# Altium footprint library XU-GENARAL PCB .PcbLib: 1176 footprints (part 61 of 75)
Each footprint in its own frame and in the unit in brackets; x right, y up, seen from the top. Pads: shape width x height; smd on the part's side, far side on the other; paste and mask are expansions set on the pad; w line width, h text height; cw(c..) or ccw(c..) is an arc to the next point about the centre after c.
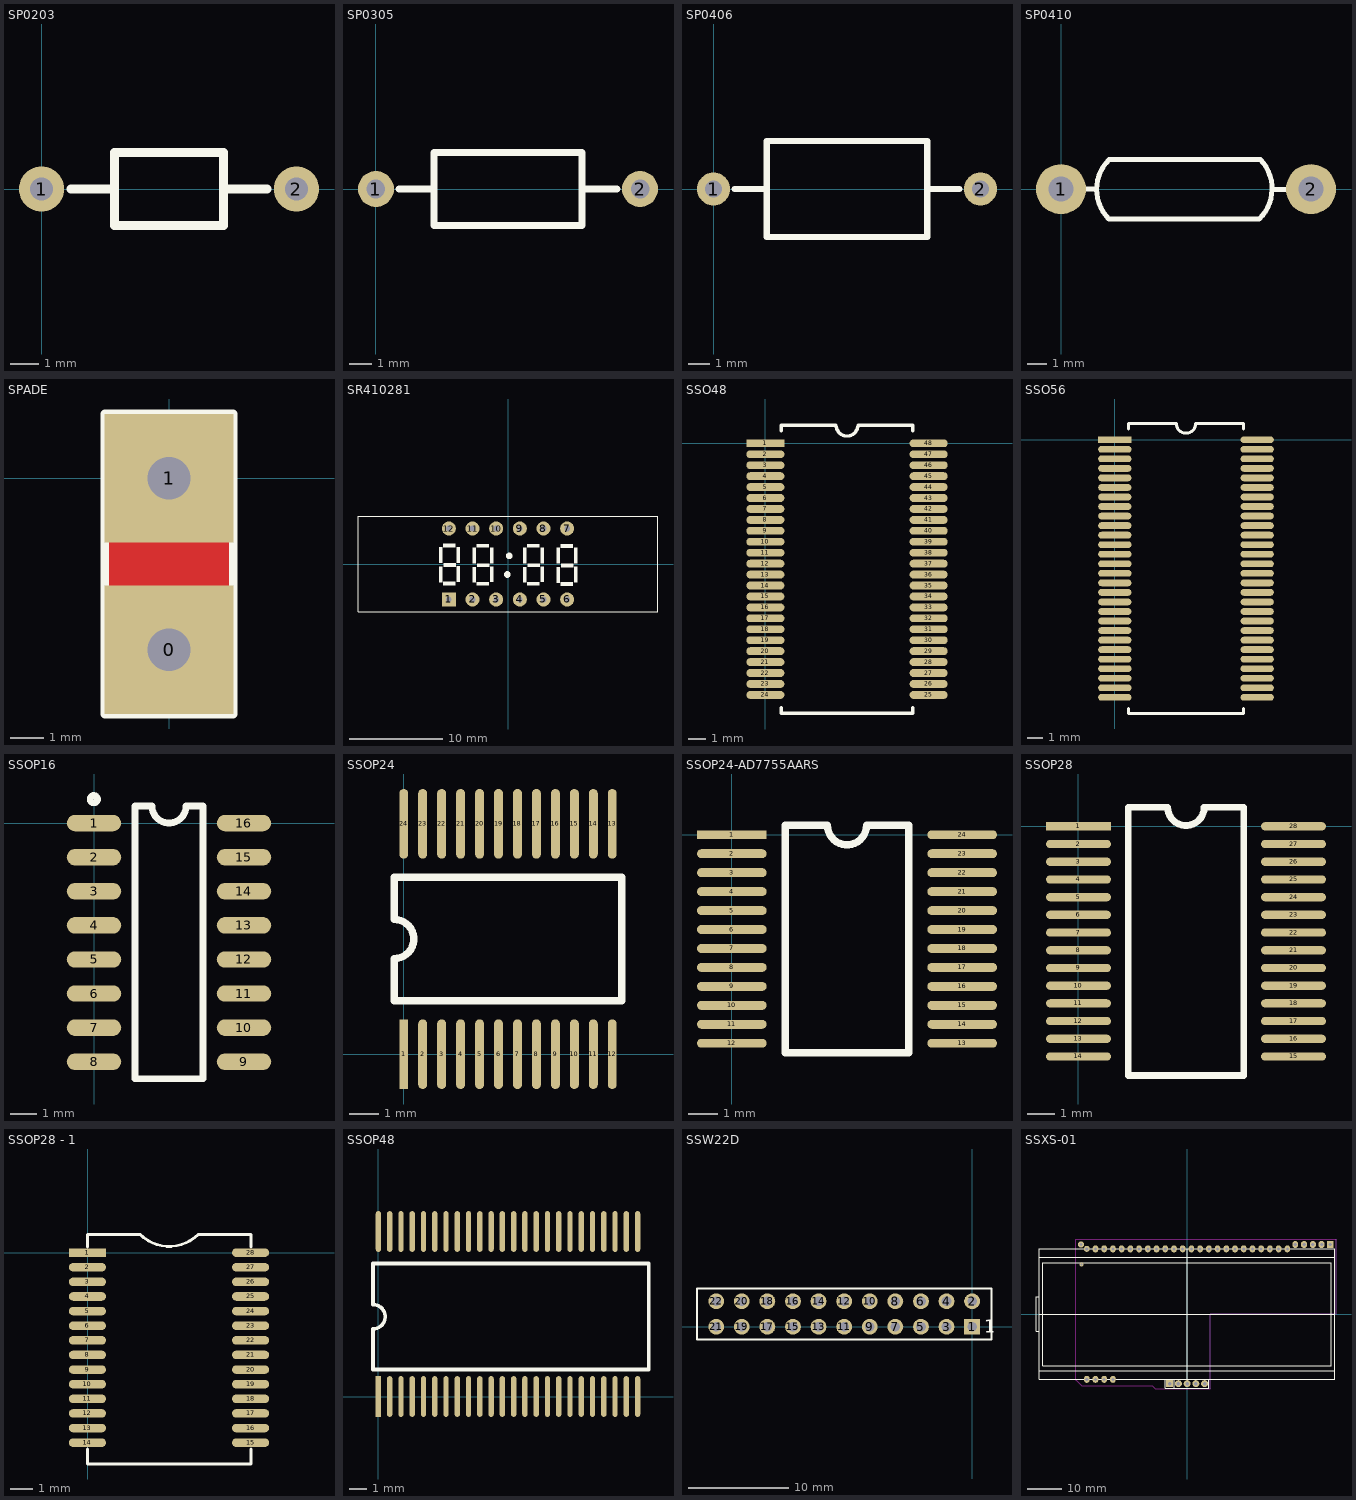
[diagram p60: the footprints below, top view; thin cyan lines are the x and y axes]

## SP0203 [mil]
pads (2):
  round 62 hole 32: 1(0,0) 2(350,0)
Top Overlay:
  lines w12: 40,0 100,0 ; 250,0 310,0 ; 100,-50 100,50 250,50 250,-50 100,-50

## SP0305 [mil]
pads (2):
  round 62 hole 32: 1(0,0) 2(456,0)
Top Overlay:
  lines w12: 40,0 100,0 ; 356,0 416,0 ; 100,-63 100,63 356,63 356,-63 100,-63

## SP0406 [mil]
pads (2):
  round 62 hole 32: 1(0,0) 2(500,0)
Top Overlay:
  lines w12: 40,0 100,0 ; 400,0 460,0 ; 100,-90 100,90 400,90 400,-90 100,-90

## SP0410 [mil]
pads (2):
  round 100 hole 50: 1(0,0) 2(500,0)
Top Overlay:
  lines w10: 28,0 70,0 ; 424,-1 468,-1 ; 96,-60 cw(c155.5,-0.5) 96,59 399,59 cw(c338,1) 396,-60 96,-60

## SPADE [mil]
pads (2):
  rect 150x150 hole 50: 0(0,-200) 1(0,0)
Top Layer:
  rectangle: -75,-150 75,-50
Bottom Layer:
  rectangle: -75,-150 75,-50
Top Overlay:
  lines w10: -75,-275 -75,75 75,75 75,-275 -75,-275

## SR410281 [mm]
pads (12):
  rect 1.5x1.5 hole 0.6: 1(-6.35,-3.81)
  round 1.5 hole 0.6: 2(-3.81,-3.81) 3(-1.27,-3.81) 4(1.27,-3.81) 5(3.81,-3.81) 6(6.35,-3.81) 7(6.35,3.81) 8(3.81,3.81) 9(1.27,3.81) 10(-1.27,3.81) 11(-3.81,3.81) 12(-6.35,3.81)
Top Overlay:
  circle w0.508: c-0.075,-1.127 r0.1
  circle w0.508: c0.125,0.873 r0.1
  rectangle: 2.057,-2.311 3.404,-1.911
  region: 3.886,-1.956 3.886,-0.254 3.486,-0.254 3.486,-1.956
  region: 2,-2.007 2,-0.305 1.6,-0.305 1.6,-2.007
  region: 3.886,0.076 3.886,1.778 3.486,1.778 3.486,0.076
  rectangle: 2.057,1.759 3.404,2.159
  region: 2,0.076 2,1.778 1.6,1.778 1.6,0.076
  rectangle: 2.083,-0.327 3.429,0.073
  rectangle: 5.639,-2.337 6.985,-1.937
  region: 7.468,-1.981 7.468,-0.279 7.068,-0.279 7.068,-1.981
  region: 5.582,-2.032 5.582,-0.33 5.182,-0.33 5.182,-2.032
  region: 7.468,0.051 7.468,1.753 7.068,1.753 7.068,0.051
  rectangle: 5.639,1.734 6.985,2.134
  region: 5.582,0.051 5.582,1.753 5.182,1.753 5.182,0.051
  rectangle: 5.664,-0.352 7.01,0.048
  rectangle: -6.96,-2.286 -5.613,-1.886
  region: -5.131,-1.93 -5.131,-0.229 -5.531,-0.229 -5.531,-1.93
  region: -7.017,-1.981 -7.017,-0.279 -7.417,-0.279 -7.417,-1.981
  region: -5.131,0.102 -5.131,1.803 -5.531,1.803 -5.531,0.102
  rectangle: -6.96,1.784 -5.613,2.184
  region: -7.017,0.102 -7.017,1.803 -7.417,1.803 -7.417,0.102
  rectangle: -6.934,-0.302 -5.588,0.098
  rectangle: -3.378,-2.311 -2.032,-1.911
  region: -1.549,-1.956 -1.549,-0.254 -1.949,-0.254 -1.949,-1.956
  region: -3.435,-2.007 -3.435,-0.305 -3.835,-0.305 -3.835,-2.007
  region: -1.549,0.076 -1.549,1.778 -1.949,1.778 -1.949,0.076
  rectangle: -3.378,1.759 -2.032,2.159
  region: -3.435,0.076 -3.435,1.778 -3.835,1.778 -3.835,0.076
  rectangle: -3.353,-0.327 -2.007,0.073
  lines w0.127: -16.1,-5.1 16.1,-5.1 16.1,5.1 -16.1,5.1 -16.1,-5.1

## SSO48 [mm]
pads (48):
  rect 2.2x0.45 smd: 1(0,0)
  oval 2.2x0.45 smd: 2(0,-0.63) 3(0,-1.26) 4(0,-1.89) 5(0,-2.52) 6(0,-3.15) 7(0,-3.78) 8(0,-4.41) 9(0,-5.04) 10(0,-5.67) 11(0,-6.3) 12(0,-6.93) 13(0,-7.56) 14(0,-8.19) 15(0,-8.82) 16(0,-9.45) 17(0,-10.08) 18(0,-10.71) 19(0,-11.34) 20(0,-11.97) 21(0,-12.6) 22(0,-13.23) 23(0,-13.86) 24(0,-14.49) 25(9.4,-14.49) 26(9.4,-13.86) 27(9.4,-13.23) 28(9.4,-12.6) 29(9.4,-11.97) 30(9.4,-11.34) 31(9.4,-10.71) 32(9.4,-10.08) 33(9.4,-9.45) 34(9.4,-8.82) 35(9.4,-8.19) 36(9.4,-7.56) 37(9.4,-6.93) 38(9.4,-6.3) 39(9.4,-5.67) 40(9.4,-5.04) 41(9.4,-4.41) 42(9.4,-3.78) 43(9.4,-3.15) 44(9.4,-2.52) 45(9.4,-1.89) 46(9.4,-1.26) 47(9.4,-0.63) 48(9.4,0)
Top Overlay:
  lines w0.2: 0.9,-15.215 0.9,-15.545 8.5,-15.545 8.5,-15.215 ; 0.9,0.725 0.9,1.055 4.065,1.055 ccw(c4.7,1.055) 5.335,1.055 8.5,1.055 8.5,0.725

## SSO56 [mm]
pads (56):
  rect 2.2x0.45 smd: 1(0,0)
  oval 2.2x0.45 smd: 2(0,-0.63) 3(0,-1.26) 4(0,-1.89) 5(0,-2.52) 6(0,-3.15) 7(0,-3.78) 8(0,-4.41) 9(0,-5.04) 10(0,-5.67) 11(0,-6.3) 12(0,-6.93) 13(0,-7.56) 14(0,-8.19) 15(0,-8.82) 16(0,-9.45) 17(0,-10.08) 18(0,-10.71) 19(0,-11.34) 20(0,-11.97) 21(0,-12.6) 22(0,-13.23) 23(0,-13.86) 24(0,-14.49) 25(0,-15.12) 26(0,-15.75) 27(0,-16.38) 28(0,-17.01) 29(9.4,-17.01) 30(9.4,-16.38) 31(9.4,-15.75) 32(9.4,-15.12) 33(9.4,-14.49) 34(9.4,-13.86) 35(9.4,-13.23) 36(9.4,-12.6) 37(9.4,-11.97) 38(9.4,-11.34) 39(9.4,-10.71) 40(9.4,-10.08) 41(9.4,-9.45) 42(9.4,-8.82) 43(9.4,-8.19) 44(9.4,-7.56) 45(9.4,-6.93) 46(9.4,-6.3) 47(9.4,-5.67) 48(9.4,-5.04) 49(9.4,-4.41) 50(9.4,-3.78) 51(9.4,-3.15) 52(9.4,-2.52) 53(9.4,-1.89) 54(9.4,-1.26) 55(9.4,-0.63) 56(9.4,0)
Top Overlay:
  lines w0.2: 0.9,-17.735 0.9,-18.075 8.5,-18.075 8.5,-17.735 ; 0.9,0.725 0.9,1.065 4.065,1.065 ccw(c4.7,1.065) 5.335,1.065 8.5,1.065 8.5,0.725

## SSOP16 [mil]
height 43.31
pads (16):
  oval 80x24 smd: 1(0,0) 2(0,-50) 3(0,-100) 4(0,-150) 5(0,-200) 6(0,-250) 7(0,-300) 8(0,-350) 9(220,-350) 10(220,-300) 11(220,-250) 12(220,-200) 13(220,-150) 14(220,-100) 15(220,-50) 16(220,0)
Top Overlay:
  circle w10: c-0.3,35 r5.3
  lines w10: 60,-375 60,25 85,25 ccw(c110,25) 135,25 160,25 160,-375 60,-375

## SSOP24 [mil]
pads (24):
  rect 12x94 smd: 1(0,0)
  oval 12x94 smd: 2(25.6,0) 3(51.2,0) 4(76.8,0) 5(102.4,0) 6(128,0) 7(153.6,0) 8(179.2,0) 9(204.8,0) 10(230.4,0) 11(256,0) 12(281.6,0) 13(281.6,311) 14(256,311) 15(230.4,311) 16(204.8,311) 17(179.2,311) 18(153.6,311) 19(128,311) 20(102.4,311) 21(76.8,311) 22(51.2,311) 23(25.6,311) 24(0,311)
Top Overlay:
  lines w10: -12.8,72 -12.8,129.1 ccw(c-12.8,155.5) -12.8,181.9 -12.8,239 294.4,239 294.4,72 -12.8,72

## SSOP24-AD7755AARS [mil]
pads (24):
  rect 94x12 smd: 1(0,0)
  oval 94x12 smd: 2(0,-25.6) 3(0,-51.2) 4(0,-76.8) 5(0,-102.4) 6(0,-128) 7(0,-153.6) 8(0,-179.2) 9(0,-204.8) 10(0,-230.4) 11(0,-256) 12(0,-281.6) 13(311,-281.6) 14(311,-256) 15(311,-230.4) 16(311,-204.8) 17(311,-179.2) 18(311,-153.6) 19(311,-128) 20(311,-102.4) 21(311,-76.8) 22(311,-51.2) 23(311,-25.6) 24(311,0)
Top Overlay:
  lines w10: 72,-294.4 72,12.8 129.1,12.8 ccw(c155.5,12.8) 181.9,12.8 239,12.8 239,-294.4 72,-294.4

## SSOP28 [mil]
pads (28):
  rect 94x12 smd: 1(0,0)
  oval 94x12 smd: 2(0,-25.6) 3(0,-51.2) 4(0,-76.8) 5(0,-102.4) 6(0,-128) 7(0,-153.6) 8(0,-179.2) 9(0,-204.8) 10(0,-230.4) 11(0,-256) 12(0,-281.6) 13(0,-307.2) 14(0,-332.8) 15(311,-332.8) 16(311,-307.2) 17(311,-281.6) 18(311,-256) 19(311,-230.4) 20(311,-204.8) 21(311,-179.2) 22(311,-153.6) 23(311,-128) 24(311,-102.4) 25(311,-76.8) 26(311,-51.2) 27(311,-25.6) 28(311,0)
Top Overlay:
  lines w10: 181.8,27.6 cw(c155.4,27.6) 129,27.6 72,27.6 72,-360.4 239,-360.4 239,27.6 182,27.6

## SSOP28 - 1 [mil]
pads (28):
  rect 65x15 smd: 1(-0.17,-0.03)
  oval 65x15 smd: 2(-0.17,-25.62) 3(-0.17,-51.21) 4(-0.17,-76.8) 5(-0.17,-102.39) 6(-0.17,-127.98) 7(-0.17,-153.57) 8(-0.17,-179.17) 9(-0.17,-204.76) 10(-0.17,-230.35) 11(-0.17,-255.94) 12(-0.17,-281.53) 13(-0.17,-307.12) 14(-0.17,-332.71) 15(285.27,-332.71) 16(285.27,-307.12) 17(285.27,-281.53) 18(285.27,-255.94) 19(285.27,-230.35) 20(285.27,-204.76) 21(285.27,-179.17) 22(285.27,-153.57) 23(285.27,-127.98) 24(285.27,-102.39) 25(285.27,-76.8) 26(285.27,-51.21) 27(285.27,-25.62) 28(285.27,-0.03)
Top Overlay:
  lines w5: -0.17,-344.03 -0.17,-370.06 285.83,-370.06 285.83,-344.03 ; -0.17,9.97 -0.17,31.97 91.83,31.97 ccw(c142.83,82.97) 193.83,31.97 285.83,31.97 285.83,9.97

## SSOP48 [mm]
pads (48):
  rect 0.3x2.3 smd: 1(0,0)
  oval 0.3x2.3 smd: 2(0.635,0) 3(1.27,0) 4(1.905,0) 5(2.54,0) 6(3.175,0) 7(3.81,0) 8(4.445,0) 9(5.08,0) 10(5.715,0) 11(6.35,0) 12(6.985,0) 13(7.62,0) 14(8.255,0) 15(8.89,0) 16(9.525,0) 17(10.16,0) 18(10.795,0) 19(11.43,0) 20(12.065,0) 21(12.7,0) 22(13.335,0) 23(13.97,0) 24(14.605,0) 25(14.605,9.3) 26(13.97,9.3) 27(13.335,9.3) 28(12.7,9.3) 29(12.065,9.3) 30(11.43,9.3) 31(10.795,9.3) 32(10.16,9.3) 33(9.525,9.3) 34(8.89,9.3) 35(8.255,9.3) 36(7.62,9.3) 37(6.985,9.3) 38(6.35,9.3) 39(5.715,9.3) 40(5.08,9.3) 41(4.445,9.3) 42(3.81,9.3) 43(3.175,9.3) 44(2.54,9.3) 45(1.905,9.3) 46(1.27,9.3) 47(0.635,9.3) 48(0,9.3)
Top Overlay:
  lines w0.203: -0.305,1.524 -0.305,3.81 ccw(c-0.305,4.496) -0.305,5.182 -0.305,7.493 15.24,7.493 15.24,1.524 -0.305,1.524

## SSW22D [mil]
pads (22):
  rect 62x62 hole 38: 1(0,0)
  round 62 hole 38: 2(0,100) 3(-100,0) 4(-100,100) 5(-200,0) 6(-200,100) 7(-300,0) 8(-300,100) 9(-400,0) 10(-400,100) 11(-500,0) 12(-500,100) 13(-600,0) 14(-600,100) 15(-700,0) 16(-700,100) 17(-800,0) 18(-800,100) 19(-900,0) 20(-900,100) 21(-1000,0) 22(-1000,100)
Top Overlay:
  lines w8: -1075,-50 -1075,150 75,150 75,-50 -1075,-50
  text "1" at 47.24,-23.62 h50

## SSXS-01 [mil]
pads (39):
  round 70 hole 30: 1(-1216,798)
  oval 65x70 hole 35: 1(-1150.09,748.06)
  rect 80x80 hole 40: 1(-199,-798)
  rect 70x80 hole 40: 1(1642,798)
  oval 65x80 hole 35: 2(-1050.09,748.06) 3(-950.09,748.06) 4(-850.09,748.06) 5(-750.09,748.06) 6(-650.09,748.06) 7(-550.09,748.06) 8(-450.09,748.06) 9(-350.09,748.06) 10(-250.09,748.06) 11(-150.09,748.06) 12(-50.09,748.06) 13(49.91,748.06) 14(149.91,748.06) 15(249.91,748.06) 16(349.91,748.06) 17(449.91,748.06) 18(549.91,748.06) 19(649.91,748.06) 20(749.91,748.06) 21(849.91,748.06) 22(949.91,748.06) 23(1049.91,748.06) 25(-1150.09,-748) 26(-1050.09,-747.92) 27(-950.09,-747.92) 28(-850.09,-747.92)
  round 80 hole 40: 2(-99,-798) 3(1,-798) 4(101,-798) 5(201,-798)
  oval 70x80 hole 40: 2(1542,798) 3(1442,798) 4(1342,798)
  oval 65x80 hole 40: 5(1242,798)
  oval 60x80 hole 35: 24(1149.91,748.06)
via -1212,568 diameter 45 hole 25
Top Overlay:
  lines w5: -1693,-196.82 -1732.37,-196.82 -1732.37,196.88 -1693,196.88 ; -1653.63,-590.52 -1653.63,590.58 1653.46,590.58 1653.46,-590.52 -1653.63,-590.52
  lines w10: -1693,-649.58 1692.83,-649.58 ; -1693,0.03 1692.83,0.03 ; -1693,649.64 1692.83,649.64 ; -149,-848 -149,-748 ; -0.09,-748 -0.09,748.06 ; -1693,-748 -1693,748.06 1692.83,748.06 1692.83,-748 -1693,-748 ; -249,-848 251,-848 251,-748 -249,-748 -249,-848
Bottom Overlay:
  lines w10: 1592,748 1592,848 ; 1192,748 1692,748 1692,848 1192,848 1192,748
Keep-Out Layer:
  lines w10: -1274,-756 -1274,858 1708,858 ; -1274,-578 -1274,-755 -1208,-821 -399,-821 -364,-856 267,-856
Mechanical 1:
  lines w10: 266,-856 266,0 269,3 1708,3 1708,858